# Altium footprint library 单平台共享多内核实验平台研制与应用.PcbLib: 46 footprints (part 2 of 3)
Each footprint in its own frame and in the unit in brackets; x right, y up, seen from the top. Pads: shape width x height; smd on the part's side, far side on the other; paste and mask are expansions set on the pad; w line width, h text height; cw(c..) or ccw(c..) is an arc to the next point about the centre after c.
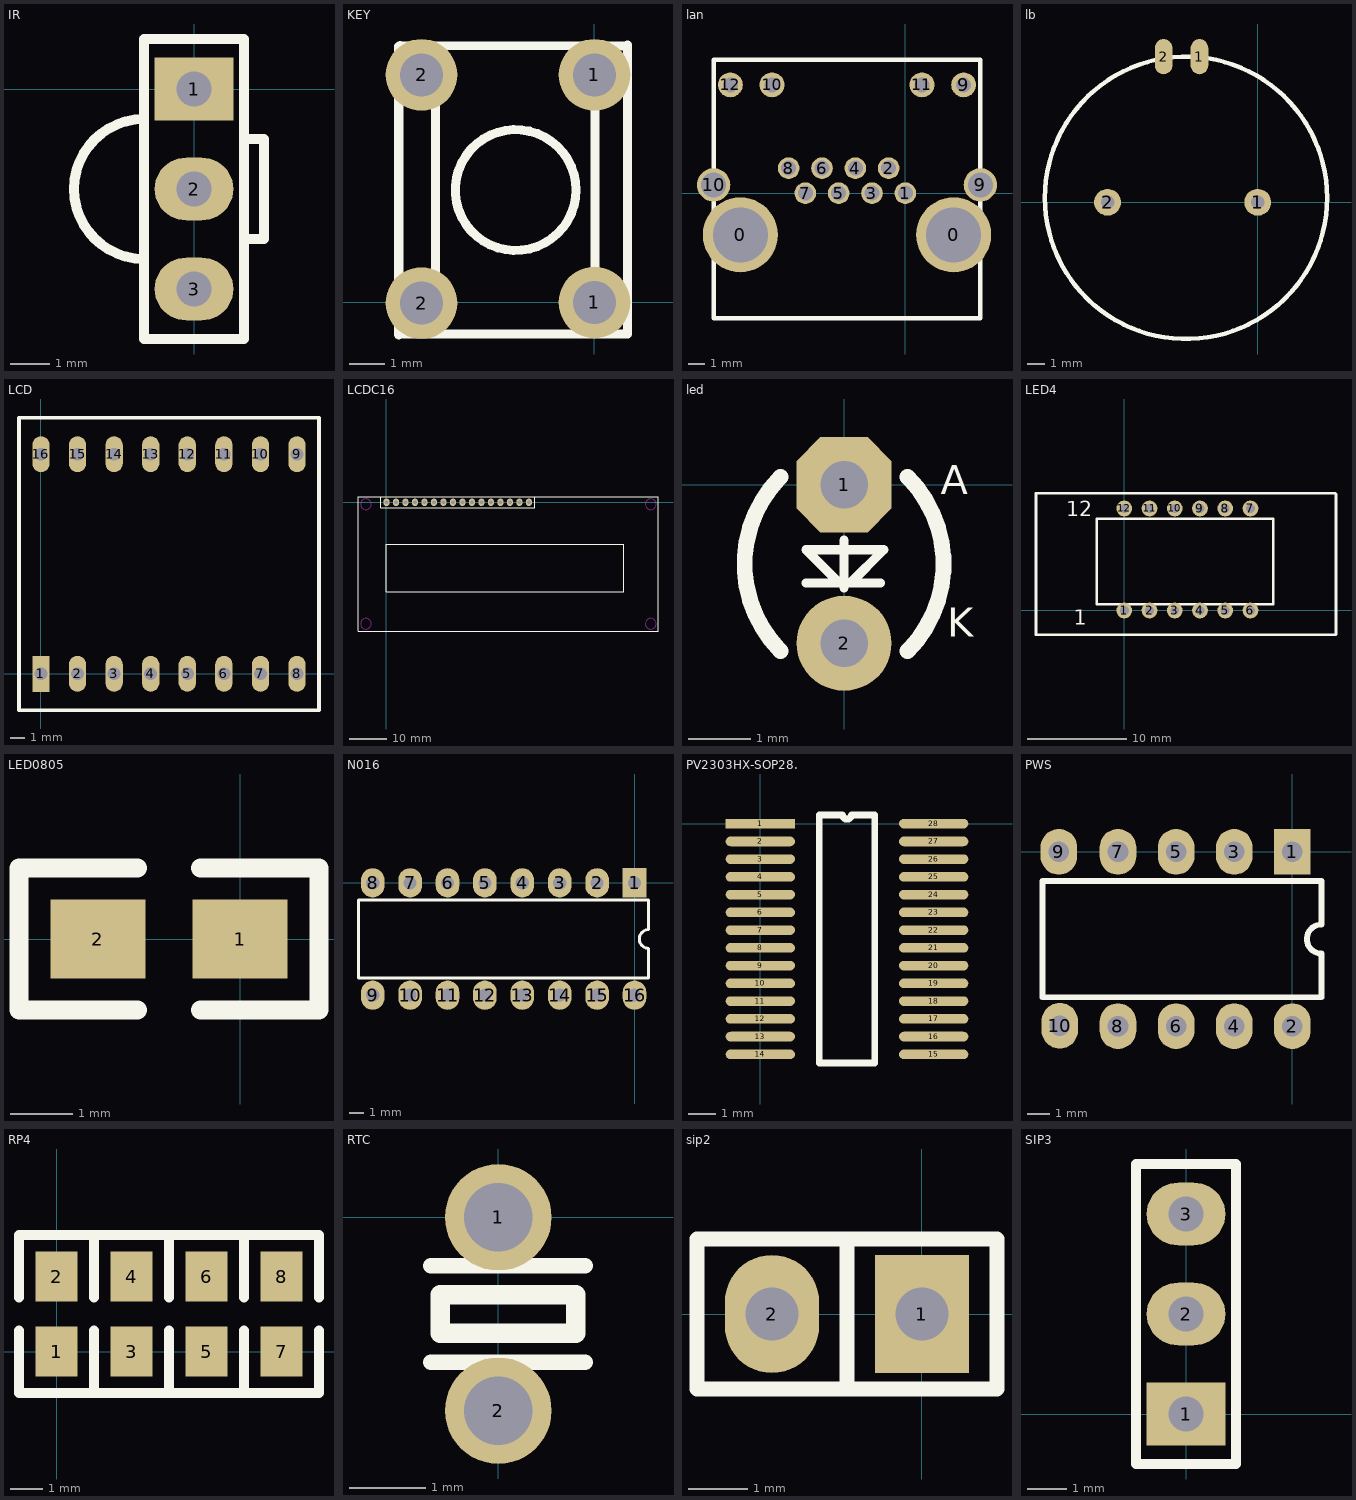
[diagram p1: the footprints below, top view; thin cyan lines are the x and y axes]

## IR [mm]
pads (3):
  rect 2x1.6 hole 0.9: 1(0,0)
  oval 2x1.6 hole 0.9: 2(0,-2.54) 3(0,-5.08)
Top Overlay:
  lines w0.254: -1.27,-4.318 cw(c-1.27,-2.54) -1.27,-0.762 ; 1.27,-3.81 1.778,-3.81 1.778,-1.27 1.27,-1.27 ; -1.27,-6.35 -1.27,1.27 1.27,1.27 1.27,-6.35 -1.27,-6.35

## KEY [mm]
pads (4):
  round 2 hole 1.2: 1(0,0) 1(0,6.35) 2(-4.826,-0.02) 2(-4.826,6.35)
Top Overlay:
  circle w0.254: c-2.2,3.136 r1.686
  lines w0.254: -5.462,-0.878 0.92,-0.88 0.92,7.188 0.892,7.16 0.775,7.16 -5.42,7.17 ; -5.46,-0.9 -5.46,7.142 ; -4.44,-0.29 -4.44,6.187 ; 0.013,-0.333 0.013,6.271

## lan [mm]
pads (16):
  round 4.5 hole 3.3: 0(-9.9,-2.5) 0(2.9,-2.5)
  round 1.3 hole 0.9: 1(0,0) 2(-1,1.5) 3(-2,0) 4(-3,1.5) 5(-4,0) 6(-5,1.5) 7(-6,0) 8(-7,1.5)
  round 1.5 hole 0.9: 9(3.5,6.5) 10(-8,6.5) 11(1,6.5) 12(-10.5,6.5)
  round 2 hole 1.5: 9(4.5,0.5) 10(-11.5,0.5)
Top Overlay:
  lines w0.254: -11.5,-7.5 -11.5,8 4.5,8 4.5,-7.5 -11.5,-7.5

## lb [mil]
pads (4):
  oval 39.37x78.74 smd: 1(-130,325) 2(-210,325)
  round 60 hole 30: 1(0,0) 2(-335,0)
Top Overlay:
  circle w10: c-160,10 r315

## LCD [mm]
pads (16):
  rect 1.2x2.5 hole 0.9: 1(0,0)
  oval 1.2x2.5 hole 0.9: 2(2.54,0) 3(5.08,0) 4(7.62,0) 5(10.16,0) 6(12.7,0) 7(15.24,0) 8(17.78,0) 9(17.78,15.24) 10(15.24,15.24) 11(12.7,15.24) 12(10.16,15.24) 13(7.62,15.24) 14(5.08,15.24) 15(2.54,15.24) 16(0,15.24)
Top Overlay:
  lines w0.254: -1.524,-2.54 -1.524,17.78 19.304,17.78 19.304,-2.54 -1.524,-2.54

## LCDC16 [mm]
pads (16):
  oval 1.6x2 hole 1: 1(0,0) 2(2.54,0) 3(5.08,0) 4(7.62,0) 5(10.16,0) 6(12.7,0) 7(15.24,0) 8(17.78,0) 9(20.32,0) 10(22.86,0) 11(25.4,0) 12(27.94,0) 13(30.48,0) 14(33.02,0) 15(35.56,0) 16(38.1,0)
Top Overlay:
  lines w0.254: -1.524,1.524 -1.524,-1.524 39.624,-1.524 39.624,1.524 ; 0.508,-23.876 63.5,-23.876 63.5,-11.176 0,-11.176 0,-23.876 1.016,-23.876 ; -7.62,-34.544 -7.62,1.016 -7.62,1.524 72.644,1.524 72.644,-34.544 -7.62,-34.544
Keep-Out Layer:
  circle w0.254: c70.699,-0.508 r1.437
  circle w0.254: c70.699,-32.512 r1.437
  circle w0.254: c-5.501,-32.512 r1.437
  circle w0.254: c-5.501,-0.508 r1.437

## led [mil]
pads (2):
  oct 60x60 hole 30: 1(0,0)
  round 60 hole 30: 2(0,-100)
Top Overlay:
  lines w5.91: -24,-62 23,-62 ; 0,-65 0,-35 ; 0,-62 -3,-62 -24,-41 25,-41 4,-62 2,-62
  lines w10: -40,-105 cw(c15,-50) -40,5 ; 40,-105 ccw(c-15,-50) 40,5
  text "K" at 65,-102 h31.5
  text "A" at 61,-12 h31.5

## LED4 [mm]
pads (12):
  round 1.6 hole 0.9: 1(0,0) 2(2.54,0) 3(5.08,0) 4(7.62,0) 5(10.16,0) 6(12.7,0) 7(12.7,10.268) 8(10.16,10.268) 9(7.62,10.268) 10(5.08,10.268) 11(2.54,10.268) 12(0,10.268)
Top Overlay:
  lines w0.254: -8.636,-2.432 19.304,-2.432 21.281,-2.432 21.313,-2.4 ; -8.636,11.792 19.304,11.792 ; -8.387,-2.432 -8.887,-2.432 -8.887,11.792 21.213,11.792 21.313,11.692 21.313,9.946 21.313,-2.4 ; 21.313,-1.3 21.313,-2.4 ; -2.794,0.616 14.986,0.616 14.986,9.252 -2.794,9.252 -2.794,0.616
  text "12" at -5.842,9.506 h1.52
  text "1" at -5.08,-1.416 h1.52

## LED0805 [mil]
pads (2):
  rect 60x50 smd: 1(0,0) 2(-90,0)
Top Overlay:
  lines w12: -65,-45 -140,-45 -140,45 -65,45 ; -25,-45 50,-45 50,45 -25,45

## N016 [mm]
pads (16):
  rect 1.6x2 hole 0.9: 1(0,0)
  oval 1.6x2 hole 0.9: 2(-2.54,0) 3(-5.08,0) 4(-7.62,0) 5(-10.16,0) 6(-12.7,0) 7(-15.24,0) 8(-17.78,0) 9(-17.78,-7.62) 10(-15.24,-7.62) 11(-12.7,-7.62) 12(-10.16,-7.62) 13(-7.62,-7.62) 14(-5.08,-7.62) 15(-2.54,-7.62) 16(0,-7.62)
Top Overlay:
  lines w0.2: -18.74,-6.46 -18.74,-1.16 0.96,-1.16 0.96,-3.175 ccw(c0.96,-3.81) 0.96,-4.445 0.96,-6.46 -18.74,-6.46

## PV2303HX-SOP28. [mil]
pads (28):
  rect 100x14 smd: 1(0,0)
  oval 100x14 smd: 2(0,-25.6) 3(0,-51.2) 4(0,-76.8) 5(0,-102.4) 6(0,-128) 7(0,-153.6) 8(0,-179.2) 9(0,-204.8) 10(0,-230.4) 11(0,-256) 12(0,-281.6) 13(0,-307.2) 14(0,-332.8) 15(250,-332.8) 16(250,-307.2) 17(250,-281.6) 18(250,-256) 19(250,-230.4) 20(250,-204.8) 21(250,-179.2) 22(250,-153.6) 23(250,-128) 24(250,-102.4) 25(250,-76.8) 26(250,-51.2) 27(250,-25.6) 28(250,0)
Top Overlay:
  lines w10: 85,-345.6 85,12.8 118.6,12.8 ccw(c125,12.8) 131.4,12.8 165,12.8 165,-345.6 85,-345.6

## PWS [mm]
pads (10):
  rect 1.6x2 hole 0.9: 1(0,0)
  oval 1.6x2 hole 0.9: 2(0,-7.618) 3(-2.54,0) 4(-2.54,-7.618) 5(-5.08,0) 6(-5.08,-7.618) 7(-7.62,0) 8(-7.62,-7.618) 9(-10.2,0.002) 10(-10.16,-7.598)
Top Overlay:
  lines w0.254: -10.922,-6.348 -10.922,-1.268 -8.892,-1.268 -8.89,-1.27 1.27,-1.27 1.27,-3.175 ccw(c1.27,-3.81) 1.27,-4.445 1.27,-6.35 -8.89,-6.35 -10.92,-6.35 -10.922,-6.348

## RP4 [mil]
pads (8):
  rect 50x60 smd: 1(0,0) 2(0,90) 3(90,0) 4(90,90) 5(180,0) 6(180,90) 7(270,0) 8(270,90)
Top Overlay:
  lines w12: -45,25 -45,-50 45,-50 ; -45,65 -45,140 45,140 ; 315,25 315,-50 225,-50 ; 315,65 315,140 225,140 ; 45,-50 135,-50 ; 45,-50 45,25 45,-50 ; 45,140 135,140 ; 45,140 45,65 45,140 ; 135,-50 225,-50 ; 135,-50 135,25 135,-50 ; 135,140 225,140 ; 135,140 135,65 135,140 ; 225,-50 225,25 225,-50 ; 225,140 225,65 225,140

## RTC [mm]
pads (2):
  round 1.4 hole 0.9: 1(0,0) 2(0,-2.54)
Top Overlay:
  lines w0.2: -0.889,-1.905 1.143,-1.905 ; -0.889,-0.635 1.143,-0.635
  lines w0.254: -0.762,-1.524 -0.762,-1.016 1.016,-1.016 1.016,-1.524 -0.762,-1.524

## sip2 [mm]
pads (2):
  rect 1.6x2 hole 0.9: 1(0,0)
  oval 1.6x2 hole 0.9: 2(-2.54,0)
Top Overlay:
  lines w0.254: -1.27,-1.27 -1.27,1.27 ; -3.81,-1.27 -3.81,1.27 1.27,1.27 1.27,-1.27 -3.81,-1.27

## SIP3 [mm]
pads (3):
  rect 2x1.6 hole 0.9: 1(0,0)
  oval 2x1.6 hole 0.9: 2(0,2.54) 3(0,5.08)
Top Overlay:
  lines w0.254: -1.27,-1.27 -1.27,6.35 1.27,6.35 1.27,-1.27 -1.27,-1.27